# Altium footprint library Connectors THD.PcbLib: 631 footprints (part 3 of 46) (continued)
## 3M_N2526-5002RB [mm] "26 Contacts - Right Angle .100\" x .100\" Low Profile Four-Wall Header" (continued)
  text "26" at 16.725,0.206 h1.02
Mechanical 15:
  lines w0.05: -0.5,0 0.5,0 ; 0,-0.5 0,0.5
3D body: height 8.64, standoff -3.98, extent -20.164,-1.587 20.171,11.267

## 3M_N2526-6002RB [mm] "26 Contacts - Straight .100\" x .100\" Low Profile Four-Wall Header"
height 10.03
pads (26):
  round 1.6 hole 1: 1(-15.24,-1.27) 2(-15.24,1.27) 3(-12.7,-1.27) 4(-12.7,1.27) 5(-10.16,-1.27) 6(-10.16,1.27) 7(-7.62,-1.27) 8(-7.62,1.27) 9(-5.08,-1.27) 10(-5.08,1.27) 11(-2.54,-1.27) 12(-2.54,1.27) 13(0,-1.27) 14(0,1.27) 15(2.54,-1.27) 16(2.54,1.27) 17(5.08,-1.27) 18(5.08,1.27) 19(7.62,-1.27) 20(7.62,1.27) 21(10.16,-1.27) 22(10.16,1.27) 23(12.7,-1.27) 24(12.7,1.27) 25(15.24,-1.27) 26(15.24,1.27)
Top Overlay:
  circle w0.3: c-15.24,-4.699 r0.15
  lines w0.2: -19.152,-1.603 -16.739,-1.603 -16.739,1.603 -19.152,1.603 ; -19.152,-1.524 -19.456,-1.524 -19.456,1.524 -19.152,1.524 ; -16.104,-4.064 -15.24,-3.2 -14.376,-4.064 ; -14.288,3.15 -19.152,3.15 ; -14.288,4.064 -14.288,2.159 -13.579,2.159 ; -12.471,-3.835 -12.471,-3.2 ; -10.389,-3.835 -10.389,-3.2 ; -10.097,2.518 -10.097,4.064 ; -2.096,-4.064 -2.096,-2.438 ; -2.096,-3.2 -19.152,-3.2 -19.152,3.15 ; 2.095,-4.064 2.095,-2.438 ; 2.095,-3.2 19.152,-3.2 19.152,3.15 16.51,3.15 ; 10.097,2.518 10.097,4.064 ; 10.097,3.15 -19.152,3.15 ; 12.929,-3.835 12.929,-3.2 ; 13.579,2.159 14.288,2.159 14.288,4.064 ; 15.011,-3.835 15.011,-3.2 ; 19.152,-1.603 16.739,-1.603 16.739,1.603 19.152,1.603 ; 19.152,-1.524 19.456,-1.524 19.456,1.524 19.152,1.524 ; -20.168,-4.064 -13.462,-4.064 -13.462,-3.835 -9.398,-3.835 -9.398,-4.064 11.938,-4.064 11.938,-3.835 16.002,-3.835 16.002,-4.064 20.168,-4.064 20.168,4.064 19.507,4.064 ccw(c19.05,4.064) 18.593,4.064 0.457,4.064 ccw(c0,4.064) -0.457,4.064 -18.593,4.064 ccw(c-19.05,4.064) -19.507,4.064 -20.168,4.064 -20.168,-4.064
  text "26" at 14.605,2.667 h1.02
Mechanical 14:
  lines w0.1: -19.152,-1.603 -16.739,-1.603 -16.739,1.603 -19.152,1.603 ; -19.152,-1.524 -19.456,-1.524 -19.456,1.524 -19.152,1.524 ; -16.104,-4.064 -15.24,-3.2 -14.376,-4.064 ; -14.288,3.15 -19.152,3.15 ; -14.288,4.064 -14.288,2.159 -10.097,2.159 -10.097,4.064 ; -12.471,-3.835 -12.471,-3.2 ; -10.389,-3.835 -10.389,-3.2 ; -2.096,-4.064 -2.096,-2.159 2.095,-2.159 2.095,-4.064 ; -2.096,-3.2 -19.152,-3.2 -19.152,3.15 ; 2.095,-3.2 19.152,-3.2 19.152,3.15 16.51,3.15 ; 10.097,3.15 -19.152,3.15 ; 10.097,4.064 10.097,2.159 14.288,2.159 14.288,4.064 ; 12.929,-3.835 12.929,-3.2 ; 15.011,-3.835 15.011,-3.2 ; 19.152,-1.603 16.739,-1.603 16.739,1.603 19.152,1.603 ; 19.152,-1.524 19.456,-1.524 19.456,1.524 19.152,1.524 ; -20.168,-4.064 -13.462,-4.064 -13.462,-3.835 -9.398,-3.835 -9.398,-4.064 11.938,-4.064 11.938,-3.835 16.002,-3.835 16.002,-4.064 20.168,-4.064 20.168,4.064 19.507,4.064 ccw(c19.05,4.064) 18.593,4.064 0.457,4.064 ccw(c0,4.064) -0.457,4.064 -18.593,4.064 ccw(c-19.05,4.064) -19.507,4.064 -20.168,4.064 -20.168,-4.064
  text "26" at 14.605,2.667 h1.02
3D body: height 9.65, standoff -2.59, extent -20.168,-4.064 20.168,4.572

## 3M_N2530-6002RB [mm] "30 Contacts - Straight .100\" x .100\" Low Profile Four-Wall Header"
height 10.03
pads (30):
  round 1.6 hole 1: 1(-17.78,-1.27) 2(-17.78,1.27) 3(-15.24,-1.27) 4(-15.24,1.27) 5(-12.7,-1.27) 6(-12.7,1.27) 7(-10.16,-1.27) 8(-10.16,1.27) 9(-7.62,-1.27) 10(-7.62,1.27) 11(-5.08,-1.27) 12(-5.08,1.27) 13(-2.54,-1.27) 14(-2.54,1.27) 15(0,-1.27) 16(0,1.27) 17(2.54,-1.27) 18(2.54,1.27) 19(5.08,-1.27) 20(5.08,1.27) 21(7.62,-1.27) 22(7.62,1.27) 23(10.16,-1.27) 24(10.16,1.27) 25(12.7,-1.27) 26(12.7,1.27) 27(15.24,-1.27) 28(15.24,1.27) 29(17.78,-1.27) 30(17.78,1.27)
Top Overlay:
  circle w0.3: c-17.78,-4.699 r0.15
  lines w0.2: -21.692,-1.603 -19.279,-1.603 -19.279,1.603 -21.692,1.603 ; -21.692,-1.524 -21.996,-1.524 -21.996,1.524 -21.692,1.524 ; -18.644,-4.064 -17.78,-3.2 -16.916,-4.064 ; -16.828,3.15 -21.692,3.15 -21.692,-3.2 -2.096,-3.2 ; -16.828,4.064 -16.828,2.159 -16.119,2.159 ; -15.011,-3.835 -15.011,-3.2 ; -12.929,-3.835 -12.929,-3.2 ; -12.637,2.518 -12.637,4.064 ; -12.637,3.15 12.637,3.15 ; -2.096,-4.064 -2.096,-2.438 ; 2.095,-4.064 2.095,-2.438 ; 2.095,-3.2 21.692,-3.2 21.692,3.15 19.05,3.15 ; 12.637,2.518 12.637,4.064 ; 15.469,-3.835 15.469,-3.2 ; 16.119,2.159 16.828,2.159 16.828,4.064 ; 17.551,-3.835 17.551,-3.2 ; 21.692,-1.603 19.279,-1.603 19.279,1.603 21.692,1.603 ; 21.692,-1.524 21.996,-1.524 21.996,1.524 21.692,1.524 ; -22.708,-4.064 -16.002,-4.064 -16.002,-3.835 -11.938,-3.835 -11.938,-4.064 14.478,-4.064 14.478,-3.835 18.542,-3.835 18.542,-4.064 22.708,-4.064 22.708,4.064 22.047,4.064 ccw(c21.59,4.064) 21.133,4.064 0.457,4.064 ccw(c0,4.064) -0.457,4.064 -21.133,4.064 ccw(c-21.59,4.064) -22.047,4.064 -22.708,4.064 -22.708,-4.064
  text "30" at 17.145,2.667 h1.02
Mechanical 14:
  lines w0.1: -21.692,-1.603 -19.279,-1.603 -19.279,1.603 -21.692,1.603 ; -21.692,-1.524 -21.996,-1.524 -21.996,1.524 -21.692,1.524 ; -18.644,-4.064 -17.78,-3.2 -16.916,-4.064 ; -16.828,3.15 -21.692,3.15 -21.692,-3.2 -2.096,-3.2 ; -16.828,4.064 -16.828,2.159 -12.637,2.159 -12.637,4.064 ; -15.011,-3.835 -15.011,-3.2 ; -12.929,-3.835 -12.929,-3.2 ; -12.637,3.15 12.637,3.15 ; -2.096,-4.064 -2.096,-2.159 2.095,-2.159 2.095,-4.064 ; 2.095,-3.2 21.692,-3.2 21.692,3.15 19.05,3.15 ; 12.637,4.064 12.637,2.159 16.828,2.159 16.828,4.064 ; 15.469,-3.835 15.469,-3.2 ; 17.551,-3.835 17.551,-3.2 ; 21.692,-1.603 19.279,-1.603 19.279,1.603 21.692,1.603 ; 21.692,-1.524 21.996,-1.524 21.996,1.524 21.692,1.524 ; -22.708,-4.064 -16.002,-4.064 -16.002,-3.835 -11.938,-3.835 -11.938,-4.064 14.478,-4.064 14.478,-3.835 18.542,-3.835 18.542,-4.064 22.708,-4.064 22.708,4.064 22.047,4.064 ccw(c21.59,4.064) 21.133,4.064 0.457,4.064 ccw(c0,4.064) -0.457,4.064 -21.133,4.064 ccw(c-21.59,4.064) -22.047,4.064 -22.708,4.064 -22.708,-4.064
  text "30" at 17.145,2.667 h1.02
3D body: height 9.65, standoff -2.59, extent -22.708,-4.064 22.708,4.572

## 3M_N2534-5002RB [mm] "34 Contacts - Right Angle .100\" x .100\" Low Profile Four-Wall Header"
height 8.59
pads (34):
  round 1.6 hole 1: 1(-20.32,-1.27) 2(-20.32,1.27) 3(-17.78,-1.27) 4(-17.78,1.27) 5(-15.24,-1.27) 6(-15.24,1.27) 7(-12.7,-1.27) 8(-12.7,1.27) 9(-10.16,-1.27) 10(-10.16,1.27) 11(-7.62,-1.27) 12(-7.62,1.27) 13(-5.08,-1.27) 14(-5.08,1.27) 15(-2.54,-1.27) 16(-2.54,1.27) 17(0,-1.27) 18(0,1.27) 19(2.54,-1.27) 20(2.54,1.27) 21(5.08,-1.27) 22(5.08,1.27) 23(7.62,-1.27) 24(7.62,1.27) 25(10.16,-1.27) 26(10.16,1.27) 27(12.7,-1.27) 28(12.7,1.27) 29(15.24,-1.27) 30(15.24,1.27) 31(17.78,-1.27) 32(17.78,1.27) 33(20.32,-1.27) 34(20.32,1.27)
Top Overlay:
  circle w0.3: c-22.09,-1.27 r0.15
  lines w0.2: -21.333,11.28 -20.317,8.74 -19.301,11.28 ; -18.539,2.466 -18.539,11.28 ; -18.539,4.015 -17.269,4.015 -17.269,6.301 cw(c-16.507,6.301) -15.745,6.301 -15.745,4.015 -14.475,4.015 ; -17.548,11.28 -17.548,10.06 -15.465,10.06 -15.465,11.28 ; -17.269,4.853 -15.745,4.853 ; -14.475,2.466 -14.475,11.28 ; -3.362,11.28 cw(c-3.362,10.01) -2.092,10.01 -2.092,4.345 ccw(c-1.457,4.345) -1.457,3.71 ; -2.092,4.853 2.099,4.853 ; -1.457,3.71 1.464,3.71 ; -0.311,4.853 0.318,4.853 0.318,10.619 ; -0.305,4.853 -0.305,10.628 ; 1.464,3.71 ccw(c1.464,4.345) 2.099,4.345 2.099,10.01 ; 2.099,10.01 cw(c3.369,10.01) 3.369,11.28 ; 17.021,2.466 17.021,11.28 ; 17.021,4.015 18.291,4.015 18.291,6.301 cw(c19.053,6.301) 19.815,6.301 19.815,4.015 21.085,4.015 ; 18.012,11.28 18.012,10.06 20.095,10.06 20.095,11.28 ; 18.291,4.853 19.815,4.853 ; 21.085,2.466 21.085,11.28 ; -0.305,10.628 -0.05,10.954 0.063,10.954 0.318,10.619 ; -0.305,10.628 0.318,10.619 ; -25.244,1.882 -25.244,11.28 25.251,11.28 25.251,1.882 23.498,1.882 cw(c23.244,1.882) 22.99,1.882 22.99,2.466 -22.984,2.466 -22.984,1.882 cw(c-23.238,1.882) -23.492,1.882 -25.244,1.882
  text "34" at 21.805,0.206 h1.02
Mechanical 14:
  circle w0.3: c-22.09,-1.27 r0.15
  lines w0.1: -21.333,11.28 -20.317,8.74 -19.301,11.28 ; -18.539,2.466 -18.539,11.28 ; -18.539,4.015 -17.269,4.015 -17.269,6.301 cw(c-16.507,6.301) -15.745,6.301 -15.745,4.015 -14.475,4.015 ; -17.548,11.28 -17.548,10.06 -15.465,10.06 -15.465,11.28 ; -17.269,4.853 -15.745,4.853 ; -14.475,2.466 -14.475,11.28 ; -3.362,11.28 cw(c-3.362,10.01) -2.092,10.01 -2.092,4.345 ccw(c-1.457,4.345) -1.457,3.71 ; -2.092,4.853 2.099,4.853 ; -1.457,3.71 1.464,3.71 ; -0.311,4.853 0.318,4.853 0.318,10.619 ; -0.305,4.853 -0.305,10.628 ; 1.464,3.71 ccw(c1.464,4.345) 2.099,4.345 2.099,10.01 ; 2.099,10.01 cw(c3.369,10.01) 3.369,11.28 ; 17.021,2.466 17.021,11.28 ; 17.021,4.015 18.291,4.015 18.291,6.301 cw(c19.053,6.301) 19.815,6.301 19.815,4.015 21.085,4.015 ; 18.012,11.28 18.012,10.06 20.095,10.06 20.095,11.28 ; 18.291,4.853 19.815,4.853 ; 21.085,2.466 21.085,11.28 ; -0.305,10.628 -0.05,10.954 0.063,10.954 0.318,10.619 ; -0.305,10.628 0.318,10.619 ; -25.244,1.882 -25.244,11.28 25.251,11.28 25.251,1.882 23.498,1.882 cw(c23.244,1.882) 22.99,1.882 22.99,2.466 -22.984,2.466 -22.984,1.882 cw(c-23.238,1.882) -23.492,1.882 -25.244,1.882
  text "34" at 21.805,0.206 h1.02
Mechanical 15:
  lines w0.05: -0.5,0 0.5,0 ; 0,-0.5 0,0.5
3D body: height 8.64, standoff -3.98, extent -25.241,-1.587 25.254,11.267

## 3M_N2534-6002RB [mm] "34 Contacts - Straight .100\" x .100\" Low Profile Four-Wall Header"
height 10.03
pads (34):
  round 1.6 hole 1: 1(-20.32,-1.27) 2(-20.32,1.27) 3(-17.78,-1.27) 4(-17.78,1.27) 5(-15.24,-1.27) 6(-15.24,1.27) 7(-12.7,-1.27) 8(-12.7,1.27) 9(-10.16,-1.27) 10(-10.16,1.27) 11(-7.62,-1.27) 12(-7.62,1.27) 13(-5.08,-1.27) 14(-5.08,1.27) 15(-2.54,-1.27) 16(-2.54,1.27) 17(0,-1.27) 18(0,1.27) 19(2.54,-1.27) 20(2.54,1.27) 21(5.08,-1.27) 22(5.08,1.27) 23(7.62,-1.27) 24(7.62,1.27) 25(10.16,-1.27) 26(10.16,1.27) 27(12.7,-1.27) 28(12.7,1.27) 29(15.24,-1.27) 30(15.24,1.27) 31(17.78,-1.27) 32(17.78,1.27) 33(20.32,-1.27) 34(20.32,1.27)
Top Overlay:
  circle w0.3: c-20.32,-4.699 r0.15
  lines w0.2: -24.232,-1.603 -21.819,-1.603 -21.819,1.603 -24.232,1.603 ; -24.232,-1.524 -24.536,-1.524 -24.536,1.524 -24.232,1.524 ; -21.184,-4.064 -20.32,-3.2 -19.456,-4.064 ; -19.368,3.15 -24.232,3.15 -24.232,-3.2 -2.096,-3.2 ; -19.368,4.064 -19.368,2.159 -18.659,2.159 ; -17.551,-3.835 -17.551,-3.2 ; -15.469,-3.835 -15.469,-3.2 ; -15.177,2.518 -15.177,4.064 ; -15.177,3.15 15.177,3.15 ; -2.096,-4.064 -2.096,-2.438 ; 2.095,-4.064 2.095,-2.438 ; 2.095,-3.2 24.232,-3.2 24.232,3.15 21.59,3.15 ; 15.177,2.518 15.177,4.064 ; 18.009,-3.835 18.009,-3.2 ; 18.659,2.159 19.368,2.159 19.368,4.064 ; 20.091,-3.835 20.091,-3.2 ; 24.232,-1.603 21.819,-1.603 21.819,1.603 24.232,1.603 ; 24.232,-1.524 24.536,-1.524 24.536,1.524 24.232,1.524 ; -25.248,-4.064 -25.248,4.064 -24.587,4.064 cw(c-24.13,4.064) -23.673,4.064 -0.457,4.064 cw(c0,4.064) 0.457,4.064 23.673,4.064 cw(c24.13,4.064) 24.587,4.064 25.248,4.064 25.248,-4.064 21.082,-4.064 21.082,-3.835 17.018,-3.835 17.018,-4.064 -14.478,-4.064 -14.478,-3.835 -18.542,-3.835 -18.542,-4.064 -25.248,-4.064
  text "34" at 19.685,2.667 h1.02
Mechanical 14:
  lines w0.1: -24.232,-1.603 -21.819,-1.603 -21.819,1.603 -24.232,1.603 ; -24.232,-1.524 -24.536,-1.524 -24.536,1.524 -24.232,1.524 ; -21.184,-4.064 -20.32,-3.2 -19.456,-4.064 ; -19.368,3.15 -24.232,3.15 -24.232,-3.2 -2.096,-3.2 ; -19.368,4.064 -19.368,2.159 -15.177,2.159 -15.177,4.064 ; -17.551,-3.835 -17.551,-3.2 ; -15.469,-3.835 -15.469,-3.2 ; -15.177,3.15 15.177,3.15 ; -2.096,-4.064 -2.096,-2.159 2.095,-2.159 2.095,-4.064 ; 2.095,-3.2 24.232,-3.2 24.232,3.15 21.59,3.15 ; 15.177,4.064 15.177,2.159 19.368,2.159 19.368,4.064 ; 18.009,-3.835 18.009,-3.2 ; 20.091,-3.835 20.091,-3.2 ; 24.232,-1.603 21.819,-1.603 21.819,1.603 24.232,1.603 ; 24.232,-1.524 24.536,-1.524 24.536,1.524 24.232,1.524 ; -25.248,-4.064 -25.248,4.064 -24.587,4.064 cw(c-24.13,4.064) -23.673,4.064 -0.457,4.064 cw(c0,4.064) 0.457,4.064 23.673,4.064 cw(c24.13,4.064) 24.587,4.064 25.248,4.064 25.248,-4.064 21.082,-4.064 21.082,-3.835 17.018,-3.835 17.018,-4.064 -14.478,-4.064 -14.478,-3.835 -18.542,-3.835 -18.542,-4.064 -25.248,-4.064
  text "34" at 19.685,2.667 h1.02
3D body: height 9.65, standoff -2.59, extent -25.248,-4.064 25.248,4.572

## 3M_N2540-6002RB [mm] "40 Contacts - Straight .100\" x .100\" Low Profile Four-Wall Header"
height 10.03
pads (40):
  round 1.6 hole 1: 1(-24.13,-1.27) 2(-24.13,1.27) 3(-21.59,-1.27) 4(-21.59,1.27) 5(-19.05,-1.27) 6(-19.05,1.27) 7(-16.51,-1.27) 8(-16.51,1.27) 9(-13.97,-1.27) 10(-13.97,1.27) 11(-11.43,-1.27) 12(-11.43,1.27) 13(-8.89,-1.27) 14(-8.89,1.27) 15(-6.35,-1.27) 16(-6.35,1.27) 17(-3.81,-1.27) 18(-3.81,1.27) 19(-1.27,-1.27) 20(-1.27,1.27) 21(1.27,-1.27) 22(1.27,1.27) 23(3.81,-1.27) 24(3.81,1.27) 25(6.35,-1.27) 26(6.35,1.27) 27(8.89,-1.27) 28(8.89,1.27) 29(11.43,-1.27) 30(11.43,1.27) 31(13.97,-1.27) 32(13.97,1.27) 33(16.51,-1.27) 34(16.51,1.27) 35(19.05,-1.27) 36(19.05,1.27) 37(21.59,-1.27) 38(21.59,1.27) 39(24.13,-1.27) 40(24.13,1.27)
Top Overlay:
  circle w0.3: c-24.13,-4.699 r0.15
  lines w0.2: -28.042,-1.603 -25.629,-1.603 -25.629,1.603 -28.042,1.603 ; -28.042,-1.524 -28.346,-1.524 -28.346,1.524 -28.042,1.524 ; -24.994,-4.064 -24.13,-3.2 -23.266,-4.064 ; -23.178,3.15 -28.042,3.15 -28.042,-3.2 -3.366,-3.2 ; -23.178,4.064 -23.178,2.159 -22.469,2.159 ; -21.361,-3.835 -21.361,-3.2 ; -19.279,-3.835 -19.279,-3.2 ; -18.987,2.518 -18.987,4.064 ; -18.987,3.15 18.987,3.15 ; -3.366,-4.064 -3.366,-2.438 ; 0.826,-4.064 0.826,-2.438 ; 0.826,-3.2 28.042,-3.2 28.042,3.15 25.4,3.15 ; 18.987,2.518 18.987,4.064 ; 21.819,-3.835 21.819,-3.2 ; 22.469,2.159 23.178,2.159 23.178,4.064 ; 23.901,-3.835 23.901,-3.2 ; 28.042,-1.603 25.629,-1.603 25.629,1.603 28.042,1.603 ; 28.042,-1.524 28.346,-1.524 28.346,1.524 28.042,1.524 ; -29.058,-4.064 -22.352,-4.064 -22.352,-3.835 -18.288,-3.835 -18.288,-4.064 20.828,-4.064 20.828,-3.835 24.892,-3.835 24.892,-4.064 29.058,-4.064 29.058,4.064 28.397,4.064 ccw(c27.94,4.064) 27.483,4.064 -0.813,4.064 ccw(c-1.27,4.064) -1.727,4.064 -27.483,4.064 ccw(c-27.94,4.064) -28.397,4.064 -29.058,4.064 -29.058,-4.064
  text "40" at 23.495,2.667 h1.02
Mechanical 14:
  lines w0.1: -28.042,-1.603 -25.629,-1.603 -25.629,1.603 -28.042,1.603 ; -28.042,-1.524 -28.346,-1.524 -28.346,1.524 -28.042,1.524 ; -24.994,-4.064 -24.13,-3.2 -23.266,-4.064 ; -23.178,3.15 -28.042,3.15 -28.042,-3.2 -3.366,-3.2 ; -23.178,4.064 -23.178,2.159 -18.987,2.159 -18.987,4.064 ; -21.361,-3.835 -21.361,-3.2 ; -19.279,-3.835 -19.279,-3.2 ; -18.987,3.15 18.987,3.15 ; -3.366,-4.064 -3.366,-2.159 0.826,-2.159 0.826,-4.064 ; 0.826,-3.2 28.042,-3.2 28.042,3.15 25.4,3.15 ; 18.987,4.064 18.987,2.159 23.178,2.159 23.178,4.064 ; 21.819,-3.835 21.819,-3.2 ; 23.901,-3.835 23.901,-3.2 ; 28.042,-1.603 25.629,-1.603 25.629,1.603 28.042,1.603 ; 28.042,-1.524 28.346,-1.524 28.346,1.524 28.042,1.524 ; -29.058,-4.064 -22.352,-4.064 -22.352,-3.835 -18.288,-3.835 -18.288,-4.064 20.828,-4.064 20.828,-3.835 24.892,-3.835 24.892,-4.064 29.058,-4.064 29.058,4.064 28.397,4.064 ccw(c27.94,4.064) 27.483,4.064 -0.813,4.064 ccw(c-1.27,4.064) -1.727,4.064 -27.483,4.064 ccw(c-27.94,4.064) -28.397,4.064 -29.058,4.064 -29.058,-4.064
  text "40" at 23.495,2.667 h1.02
3D body: height 9.65, standoff -2.59, extent -29.058,-4.064 29.058,4.572

## 3M_N2550-5002RB [mm] "50 Contacts - Right Angle .100\" x .100\" Low Profile Four-Wall Header"
height 8.59
pads (50):
  round 1.6 hole 0.9: 1(-30.48,-1.27) 2(-30.48,1.27) 3(-27.94,-1.27) 4(-27.94,1.27) 5(-25.4,-1.27) 6(-25.4,1.27) 7(-22.86,-1.27) 8(-22.86,1.27) 9(-20.32,-1.27) 10(-20.32,1.27) 11(-17.78,-1.27) 12(-17.78,1.27) 13(-15.24,-1.27) 14(-15.24,1.27) 15(-12.7,-1.27) 16(-12.7,1.27) 17(-10.16,-1.27) 18(-10.16,1.27) 19(-7.62,-1.27) 20(-7.62,1.27) 21(-5.08,-1.27) 22(-5.08,1.27) 23(-2.54,-1.27) 24(-2.54,1.27) 25(0,-1.27) 26(0,1.27) 27(2.54,-1.27) 28(2.54,1.27) 29(5.08,-1.27) 30(5.08,1.27) 31(7.62,-1.27) 32(7.62,1.27) 33(10.16,-1.27) 34(10.16,1.27) 35(12.7,-1.27) 36(12.7,1.27) 37(15.24,-1.27) 38(15.24,1.27) 39(17.78,-1.27) 40(17.78,1.27) 41(20.32,-1.27) 42(20.32,1.27) 43(22.86,-1.27) 44(22.86,1.27) 45(25.4,-1.27) 46(25.4,1.27) 47(27.94,-1.27) 48(27.94,1.27) 49(30.48,-1.27) 50(30.48,1.27)
Top Overlay:
  circle w0.3: c-32.25,-1.27 r0.15
  lines w0.2: -28.702,2.459 -28.702,11.273 ; -28.702,4.009 -27.432,4.009 -27.432,6.295 ; -27.711,11.273 -27.711,10.054 -25.629,10.054 -25.629,11.273 ; -27.432,4.85 -25.908,4.847 ; -27.432,6.297 cw(c-26.67,6.297) -25.908,6.297 ; -25.908,6.295 -25.908,4.009 -24.638,4.007 ; -24.638,2.459 -24.638,11.273 ; -3.366,11.273 cw(c-3.366,10.003) -2.096,10.003 -2.095,4.339 ccw(c-1.46,4.339) -1.46,3.704 1.46,3.704 ccw(c1.46,4.339) 2.095,4.339 2.095,10.003 cw(c3.366,10.003) 3.366,11.273 ; -2.095,4.847 2.095,4.847 ; -0.314,4.853 -0.314,10.719 ; 0.314,4.847 0.314,10.719 ; 27.178,2.459 27.178,11.273 ; 27.178,4.009 28.448,4.009 28.448,6.295 cw(c29.21,6.295) 29.972,6.295 29.972,4.009 31.242,4.009 ; 28.448,4.847 29.972,4.847 ; 31.242,2.459 31.242,11.273 ; -0.314,10.719 -0.06,10.973 0.06,10.973 0.314,10.719 ; -0.314,10.719 0.314,10.719 ; -35.408,1.875 -33.655,1.875 ccw(c-33.401,1.875) -33.147,1.875 -33.147,2.459 33.147,2.459 33.147,1.875 ccw(c33.401,1.875) 33.655,1.875 35.408,1.875 35.408,11.273 -35.408,11.273 -35.408,1.875
  text "50" at 31.965,0.206 h1.02
Mechanical 8:
  drawing of 204 lines, arcs and shapes, not listed
Mechanical 14:
  circle w0.3: c-32.25,-1.27 r0.15
  lines w0.1: -28.702,2.459 -28.702,11.273 ; -28.702,4.009 -27.432,4.009 -27.432,6.295 ; -27.711,11.273 -27.711,10.054 -25.629,10.054 -25.629,11.273 ; -27.432,4.85 -25.908,4.847 ; -27.432,6.297 cw(c-26.67,6.297) -25.908,6.297 ; -25.908,6.295 -25.908,4.009 -24.638,4.007 ; -24.638,2.459 -24.638,11.273 ; -3.366,11.273 cw(c-3.366,10.003) -2.096,10.003 -2.095,4.339 ccw(c-1.46,4.339) -1.46,3.704 1.46,3.704 ccw(c1.46,4.339) 2.095,4.339 2.095,10.003 cw(c3.366,10.003) 3.366,11.273 ; -2.095,4.847 2.095,4.847 ; -0.314,4.853 -0.314,10.719 ; 0.314,4.847 0.314,10.719 ; 27.178,2.459 27.178,11.273 ; 27.178,4.009 28.448,4.009 28.448,6.295 cw(c29.21,6.295) 29.972,6.295 29.972,4.009 31.242,4.009 ; 28.448,4.847 29.972,4.847 ; 31.242,2.459 31.242,11.273 ; -0.314,10.719 -0.06,10.973 0.06,10.973 0.314,10.719 ; -0.314,10.719 0.314,10.719 ; -35.408,1.875 -33.655,1.875 ccw(c-33.401,1.875) -33.147,1.875 -33.147,2.459 33.147,2.459 33.147,1.875 ccw(c33.401,1.875) 33.655,1.875 35.408,1.875 35.408,11.273 -35.408,11.273 -35.408,1.875
  text "50" at 31.965,0.206 h1.02
3D body: height 8.69, standoff -3.98, extent -35.408,-1.575 35.408,11.273

## 3M_N2550-6002RB [mm] "50 Contacts - Straight .100\" x .100\" Low Profile Four-Wall Header"
height 10.03
pads (50):
  round 1.6 hole 1: 1(-30.48,-1.27) 2(-30.48,1.27) 3(-27.94,-1.27) 4(-27.94,1.27) 5(-25.4,-1.27) 6(-25.4,1.27) 7(-22.86,-1.27) 8(-22.86,1.27) 9(-20.32,-1.27) 10(-20.32,1.27) 11(-17.78,-1.27) 12(-17.78,1.27) 13(-15.24,-1.27) 14(-15.24,1.27) 15(-12.7,-1.27) 16(-12.7,1.27) 17(-10.16,-1.27) 18(-10.16,1.27) 19(-7.62,-1.27) 20(-7.62,1.27) 21(-5.08,-1.27) 22(-5.08,1.27) 23(-2.54,-1.27) 24(-2.54,1.27) 25(0,-1.27) 26(0,1.27) 27(2.54,-1.27) 28(2.54,1.27) 29(5.08,-1.27) 30(5.08,1.27) 31(7.62,-1.27) 32(7.62,1.27) 33(10.16,-1.27) 34(10.16,1.27) 35(12.7,-1.27) 36(12.7,1.27) 37(15.24,-1.27) 38(15.24,1.27) 39(17.78,-1.27) 40(17.78,1.27) 41(20.32,-1.27) 42(20.32,1.27) 43(22.86,-1.27) 44(22.86,1.27) 45(25.4,-1.27) 46(25.4,1.27) 47(27.94,-1.27) 48(27.94,1.27) 49(30.48,-1.27) 50(30.48,1.27)
Top Overlay:
  circle w0.3: c-30.48,-4.699 r0.15
  lines w0.2: -34.392,-1.603 -31.979,-1.603 -31.979,1.603 -34.392,1.603 ; -34.392,-1.524 -34.696,-1.524 -34.696,1.524 -34.392,1.524 ; -31.344,-4.064 -30.48,-3.2 -29.616,-4.064 ; -29.528,3.15 -34.392,3.15 -34.392,-3.2 -2.096,-3.2 ; -29.528,4.064 -29.528,2.159 -28.819,2.159 ; -27.711,-3.835 -27.711,-3.2 ; -25.629,-3.835 -25.629,-3.2 ; -25.337,2.518 -25.337,4.064 ; -25.337,3.15 25.337,3.15 ; -2.096,-4.064 -2.096,-2.438 ; 2.095,-4.064 2.095,-2.438 ; 2.095,-3.2 34.392,-3.2 34.392,3.15 31.75,3.15 ; 25.337,2.518 25.337,4.064 ; 28.169,-3.835 28.169,-3.2 ; 28.819,2.159 29.528,2.159 29.528,4.064 ; 30.251,-3.835 30.251,-3.2 ; 34.392,-1.603 31.979,-1.603 31.979,1.603 34.392,1.603 ; 34.392,-1.524 34.696,-1.524 34.696,1.524 34.392,1.524 ; -35.408,-4.064 -28.702,-4.064 -28.702,-3.835 -24.638,-3.835 -24.638,-4.064 27.178,-4.064 27.178,-3.835 31.242,-3.835 31.242,-4.064 35.408,-4.064 35.408,4.064 34.747,4.064 ccw(c34.29,4.064) 33.833,4.064 0.457,4.064 ccw(c0,4.064) -0.457,4.064 -33.833,4.064 ccw(c-34.29,4.064) -34.747,4.064 -35.408,4.064 -35.408,-4.064
  text "50" at 29.845,2.667 h1.02
Mechanical 14:
  lines w0.1: -34.392,-1.603 -31.979,-1.603 -31.979,1.603 -34.392,1.603 ; -34.392,-1.524 -34.696,-1.524 -34.696,1.524 -34.392,1.524 ; -31.344,-4.064 -30.48,-3.2 -29.616,-4.064 ; -29.528,3.15 -34.392,3.15 -34.392,-3.2 -2.096,-3.2 ; -29.528,4.064 -29.528,2.159 -25.337,2.159 -25.337,4.064 ; -27.711,-3.835 -27.711,-3.2 ; -25.629,-3.835 -25.629,-3.2 ; -25.337,3.15 25.337,3.15 ; -2.096,-4.064 -2.096,-2.159 2.095,-2.159 2.095,-4.064 ; 2.095,-3.2 34.392,-3.2 34.392,3.15 31.75,3.15 ; 25.337,4.064 25.337,2.159 29.528,2.159 29.528,4.064 ; 28.169,-3.835 28.169,-3.2 ; 30.251,-3.835 30.251,-3.2 ; 34.392,-1.603 31.979,-1.603 31.979,1.603 34.392,1.603 ; 34.392,-1.524 34.696,-1.524 34.696,1.524 34.392,1.524 ; -35.408,-4.064 -28.702,-4.064 -28.702,-3.835 -24.638,-3.835 -24.638,-4.064 27.178,-4.064 27.178,-3.835 31.242,-3.835 31.242,-4.064 35.408,-4.064 35.408,4.064 34.747,4.064 ccw(c34.29,4.064) 33.833,4.064 0.457,4.064 ccw(c0,4.064) -0.457,4.064 -33.833,4.064 ccw(c-34.29,4.064) -34.747,4.064 -35.408,4.064 -35.408,-4.064
  text "50" at 29.845,2.667 h1.02
3D body: height 9.65, standoff -2.59, extent -35.408,-4.064 35.408,4.572

## 3M_N2560-6002RB [mm] "60 Contacts - Straight .100\" x .100\" Low Profile Four-Wall Header"
height 10.03
pads (60):
  round 1.6 hole 1: 1(-36.83,-1.27) 2(-36.83,1.27) 3(-34.29,-1.27) 4(-34.29,1.27) 5(-31.75,-1.27) 6(-31.75,1.27) 7(-29.21,-1.27) 8(-29.21,1.27) 9(-26.67,-1.27) 10(-26.67,1.27) 11(-24.13,-1.27) 12(-24.13,1.27) 13(-21.59,-1.27) 14(-21.59,1.27) 15(-19.05,-1.27) 16(-19.05,1.27) 17(-16.51,-1.27) 18(-16.51,1.27) 19(-13.97,-1.27) 20(-13.97,1.27) 21(-11.43,-1.27) 22(-11.43,1.27) 23(-8.89,-1.27) 24(-8.89,1.27) 25(-6.35,-1.27) 26(-6.35,1.27) 27(-3.81,-1.27) 28(-3.81,1.27) 29(-1.27,-1.27) 30(-1.27,1.27) 31(1.27,-1.27) 32(1.27,1.27) 33(3.81,-1.27) 34(3.81,1.27) 35(6.35,-1.27) 36(6.35,1.27) 37(8.89,-1.27) 38(8.89,1.27) 39(11.43,-1.27) 40(11.43,1.27) 41(13.97,-1.27) 42(13.97,1.27) 43(16.51,-1.27) 44(16.51,1.27) 45(19.05,-1.27) 46(19.05,1.27) 47(21.59,-1.27) 48(21.59,1.27) 49(24.13,-1.27) 50(24.13,1.27) 51(26.67,-1.27) 52(26.67,1.27) 53(29.21,-1.27) 54(29.21,1.27) 55(31.75,-1.27) 56(31.75,1.27) 57(34.29,-1.27) 58(34.29,1.27) 59(36.83,-1.27) 60(36.83,1.27)
Top Overlay:
  circle w0.3: c-36.83,-4.699 r0.15
  lines w0.2: -40.742,-1.603 -38.329,-1.603 -38.329,1.603 -40.742,1.603 ; -40.742,-1.524 -41.046,-1.524 -41.046,1.524 -40.742,1.524 ; -37.694,-4.064 -36.83,-3.2 -35.966,-4.064 ; -35.878,3.15 -40.742,3.15 -40.742,-3.2 -3.366,-3.2 ; -35.878,4.064 -35.878,2.159 -35.169,2.159 ; -34.061,-3.835 -34.061,-3.2 ; -31.979,-3.835 -31.979,-3.2 ; -31.687,2.518 -31.687,4.064 ; -31.687,3.15 31.687,3.15 ; -3.366,-4.064 -3.366,-2.438 ; 0.826,-4.064 0.826,-2.438 ; 0.826,-3.2 40.742,-3.2 40.742,3.15 38.1,3.15 ; 31.687,2.518 31.687,4.064 ; 34.519,-3.835 34.519,-3.2 ; 35.169,2.159 35.878,2.159 35.878,4.064 ; 36.601,-3.835 36.601,-3.2 ; 40.742,-1.603 38.329,-1.603 38.329,1.603 40.742,1.603 ; 40.742,-1.524 41.046,-1.524 41.046,1.524 40.742,1.524 ; -41.758,-4.064 -41.758,4.064 -41.097,4.064 cw(c-40.64,4.064) -40.183,4.064 -1.727,4.064 cw(c-1.27,4.064) -0.813,4.064 40.183,4.064 cw(c40.64,4.064) 41.097,4.064 41.758,4.064 41.758,-4.064 37.592,-4.064 37.592,-3.835 33.528,-3.835 33.528,-4.064 -30.988,-4.064 -30.988,-3.835 -35.052,-3.835 -35.052,-4.064 -41.758,-4.064
  text "60" at 36.195,2.667 h1.02
Mechanical 14:
  lines w0.1: -40.742,-1.603 -38.329,-1.603 -38.329,1.603 -40.742,1.603 ; -40.742,-1.524 -41.046,-1.524 -41.046,1.524 -40.742,1.524 ; -37.694,-4.064 -36.83,-3.2 -35.966,-4.064 ; -35.878,3.15 -40.742,3.15 -40.742,-3.2 -3.366,-3.2 ; -35.878,4.064 -35.878,2.159 -31.687,2.159 -31.687,4.064 ; -34.061,-3.835 -34.061,-3.2 ; -31.979,-3.835 -31.979,-3.2 ; -31.687,3.15 31.687,3.15 ; -3.366,-4.064 -3.366,-2.159 0.826,-2.159 0.826,-4.064 ; 0.826,-3.2 40.742,-3.2 40.742,3.15 38.1,3.15 ; 31.687,4.064 31.687,2.159 35.878,2.159 35.878,4.064 ; 34.519,-3.835 34.519,-3.2 ; 36.601,-3.835 36.601,-3.2 ; 40.742,-1.603 38.329,-1.603 38.329,1.603 40.742,1.603 ; 40.742,-1.524 41.046,-1.524 41.046,1.524 40.742,1.524 ; -41.758,-4.064 -41.758,4.064 -41.097,4.064 cw(c-40.64,4.064) -40.183,4.064 -1.727,4.064 cw(c-1.27,4.064) -0.813,4.064 40.183,4.064 cw(c40.64,4.064) 41.097,4.064 41.758,4.064 41.758,-4.064 37.592,-4.064 37.592,-3.835 33.528,-3.835 33.528,-4.064 -30.988,-4.064 -30.988,-3.835 -35.052,-3.835 -35.052,-4.064 -41.758,-4.064
  text "60" at 36.195,2.667 h1.02
3D body: height 9.65, standoff -2.59, extent -41.758,-4.064 41.758,4.572